# Altium footprint library 04.连接器件.pcb.PCBLIB: 363 footprints (part 7 of 23)
Each footprint in its own frame and in the unit in brackets; x right, y up, seen from the top. Pads: shape width x height; smd on the part's side, far side on the other; paste and mask are expansions set on the pad; w line width, h text height; cw(c..) or ccw(c..) is an arc to the next point about the centre after c.
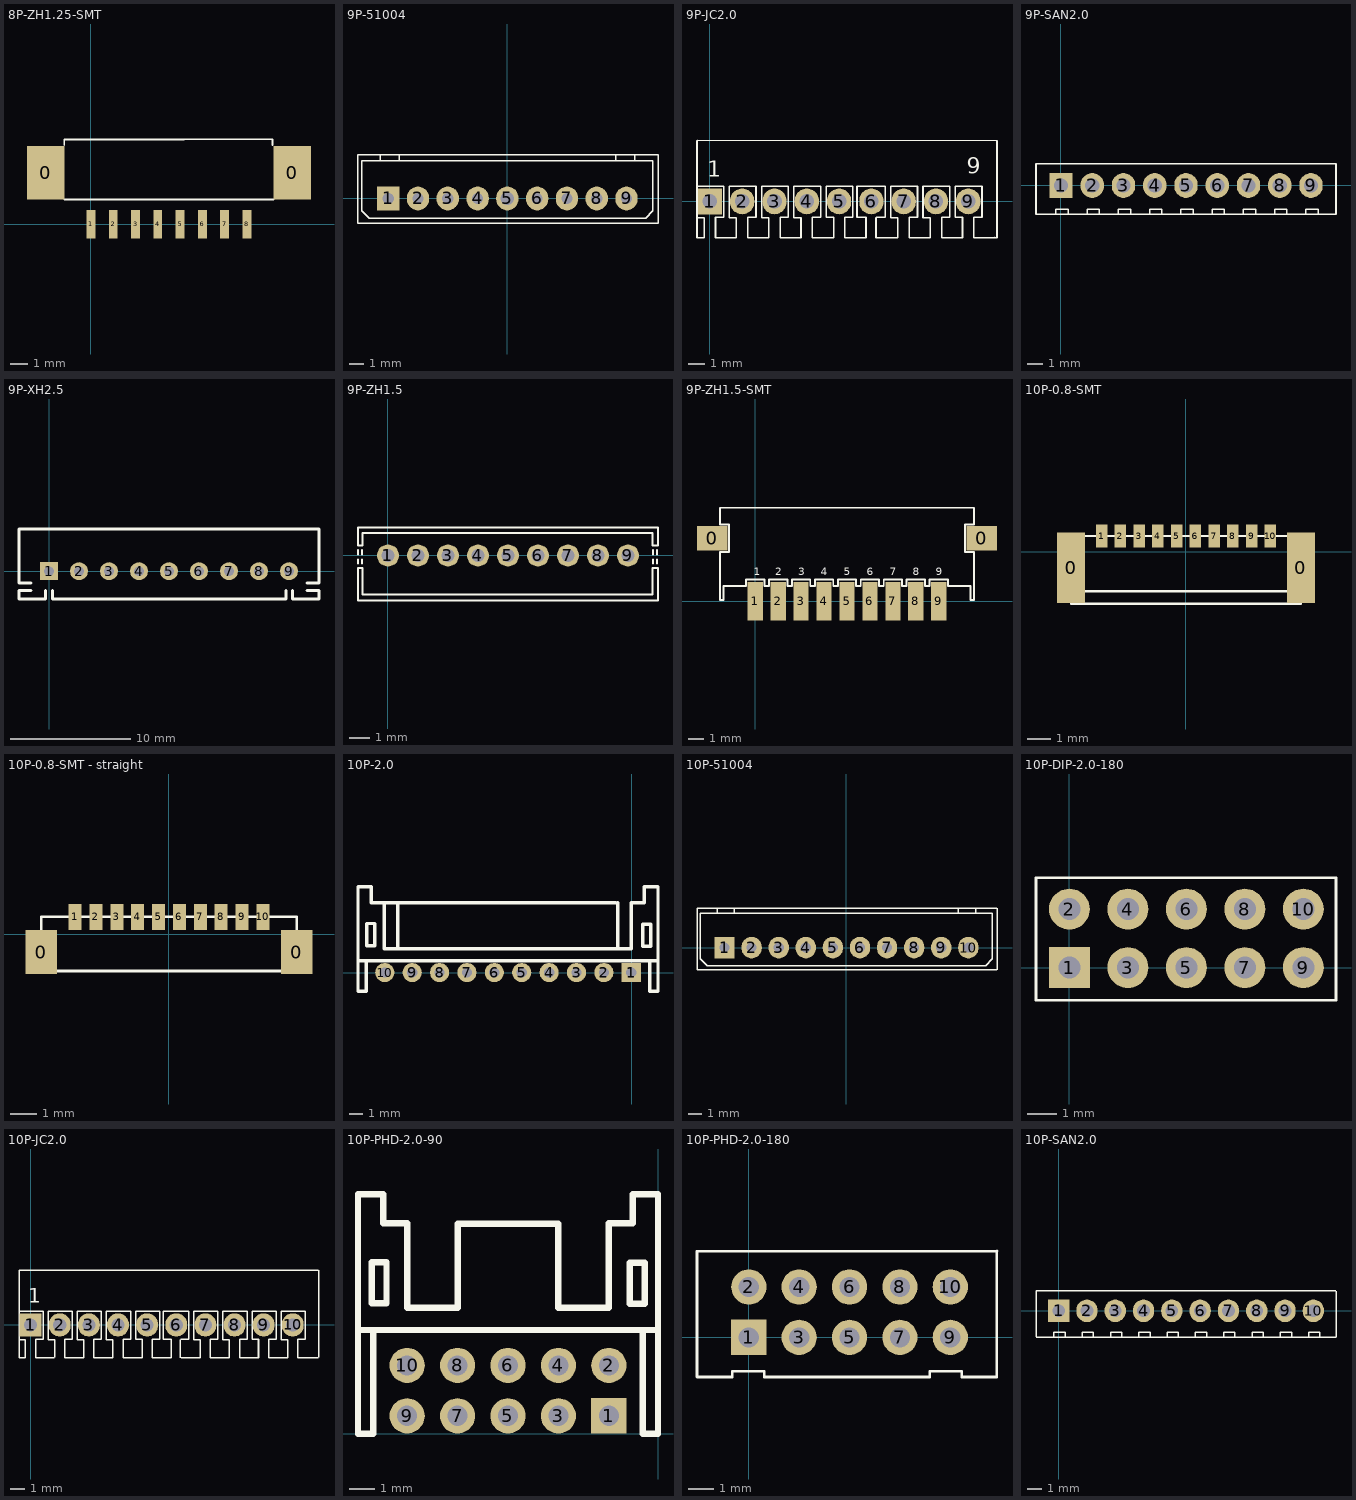
[diagram p6: the footprints below, top view; thin cyan lines are the x and y axes]

## 8P-ZH1.25-SMT [mm]
pads (10):
  rect 2.1x3 smd: 0(-2.54,2.896) 0(11.299,2.896)
  rect 0.5x1.6 smd: 1(0,0) 2(1.25,0) 3(2.5,0) 4(3.75,0) 5(5,0) 6(6.25,0) 7(7.5,0) 8(8.75,0)
TopOverlay:
  lines w0.1: -1.5,1.4 0,1.4 5.25,1.4 10.25,1.4 ; -1.5,4.445 -1.5,4.774 5.232,4.774 10.185,4.775 ; 10.184,4.445 10.184,4.774
3D body: height 0.3, standoff 0, extent 8.382,-0.889 9.144,0.889
3D body: height 0.3, standoff 0, extent 7.112,-0.889 7.874,0.889
3D body: height 0.3, standoff 0, extent 5.842,-0.889 6.604,0.889
3D body: height 0.3, standoff 0, extent 4.572,-0.889 5.334,0.889
3D body: height 0.3, standoff 0, extent 3.302,-0.889 4.064,0.889
3D body: height 0.3, standoff 0, extent 2.159,-0.889 2.921,0.889
3D body: height 0.3, standoff 0, extent 0.889,-0.889 1.651,0.889
3D body: height 0.3, standoff 0, extent -0.381,-0.889 0.381,0.889
3D body: height 3.7, standoff 0, extent -1.499,4.75 10.185,4.775
3D body: height 3.7, standoff 0, extent -1.499,1.397 10.211,4.775

## 9P-51004 [mm]
pads (9):
  rect 1.5x1.6 hole 0.75: 1(-8,0)
  oval 1.5x1.6 hole 0.75: 2(-6,0) 3(-4,0) 4(-2,0) 6(2,0) 7(4,0) 8(6,0) 9(8,0)
  oval 1.5x1.6 hole 0.9: 5(0,0)
TopOverlay:
  lines w0.1: -8.54,2.54 -8.54,2.921 ; -7.27,2.54 -7.27,2.921 ; 2.226,2.54 9.774,2.54 9.774,-0.833 9.282,-1.325 5,-1.325 ; 2.286,2.54 -9.774,2.54 -9.774,-0.833 -9.282,-1.325 5.055,-1.325 ; 7.27,2.54 7.27,2.921 ; 8.54,2.54 8.54,2.921 ; -10.032,-1.651 -10.032,2.921 10.115,2.921 10.115,-1.651 -10.032,-1.651
3D body "510004-9.STEP": height 5.9, standoff -3.47, extent -9.957,-1.565 10.043,2.835

## 9P-JC2.0 [mm]
pads (9):
  rect 1.5x1.6 hole 0.9: 1(0,0)
  oval 1.5x1.6 hole 0.9: 2(2,0) 3(4,0) 4(6,0) 5(8,0) 6(10,0) 7(12,0) 8(14,0) 9(16,0)
TopOverlay:
  lines w0.1: -0.8,3.75 -0.8,0.94 ; -0.787,3.785 17.78,3.75 17.78,-2.25 ; 1.623,-2.25 0.349,-2.25 0.349,-0.991 0.857,-0.991 0.857,0.94 -0.8,0.94 ; 1.638,-2.235 1.638,-1.016 1.2,-1.016 1.2,0.94 2.857,0.94 2.857,-0.991 2.349,-0.991 2.349,-2.25 3.2,-2.25 3.623,-2.25 3.638,-2.235 3.638,-1.016 3.2,-1.016 3.2,0.94 4.857,0.94 4.857,-0.991 4.349,-0.991 4.349,-2.25 5.623,-2.25 5.638,-2.235 5.638,-1.016 5.2,-1.016 5.2,0.94 6.857,0.94 6.857,-0.991 6.349,-0.991 6.349,-2.25 7.67,-2.25 7.67,-0.991 7.2,-0.991 7.2,0.94 8.857,0.94 8.857,-0.991 8.349,-0.991 8.349,-2.25 9.67,-2.25 9.67,-0.991 9.111,-0.991 9.111,0.94 10.864,0.94 10.864,-0.991 10.305,-0.991 ; 7.623,-2.25 7.638,-2.235 ; 10.289,-2.25 10.289,-1.005 ; 10.349,-2.25 11.2,-2.25 11.623,-2.25 11.638,-2.235 11.638,-1.016 11.2,-1.016 11.2,0.94 12.857,0.94 12.857,-0.991 12.349,-0.991 12.349,-2.25 13.623,-2.25 13.638,-2.235 13.638,-1.016 13.2,-1.016 13.2,0.94 14.857,0.94 14.857,-0.991 14.349,-0.991 14.349,-2.25 15.67,-2.25 15.67,-0.991 15.2,-0.991 15.2,0.94 16.857,0.94 ; 10.349,-0.991 10.857,-0.991 10.857,0.94 ; 15.623,-2.25 15.638,-2.235 15.638,-1.016 ; 16.329,-2.25 16.329,-0.991 16.837,-0.991 16.837,0.94 ; 16.36,-2.25 17.771,-2.25 ; 17.638,-2.235 17.623,-2.25 17.2,-2.25 16.349,-2.25 ; -0.8,-1.016 -0.8,-2.25 -0.377,-2.25 -0.362,-2.235 -0.362,-1.016 -0.8,-1.016 ; -0.8,-1.016 -0.8,0.94 ; 16.349,-2.25 16.349,-0.991 ; 16.349,-2.25 16.349,-0.991 ; 16.349,-0.991 16.857,-0.991 ; 16.349,-0.991 16.857,-0.991 ; 16.857,-0.991 16.857,0.94 ; 16.857,-0.991 16.857,0.94
  text "1" at -0.152,1.524 h1
  text "9" at 15.9,1.727 h1
3D body "9P-JC2.0.STEP": height 3.4, standoff -3.22, extent -1.219,-7.112 17.281,3.888

## 9P-SAN2.0 [mm]
pads (9):
  rect 1.5x1.6 hole 0.9: 1(0,0)
  oval 1.5x1.6 hole 0.9: 2(2,0) 3(4,0) 4(6,0) 5(8,0) 6(10,0) 7(12,0) 8(14,0) 9(16,0)
TopOverlay:
  lines w0.1: -1.6,-1.85 -1.6,1.4 17.577,1.4 ; -1.575,-1.854 17.551,-1.854 ; -0.33,-1.85 -0.33,-1.524 0.457,-1.524 0.457,-1.85 ; 1.67,-1.85 1.67,-1.524 2.457,-1.524 2.457,-1.85 ; 3.67,-1.85 3.67,-1.524 4.457,-1.524 4.457,-1.85 ; 5.67,-1.85 5.67,-1.524 6.457,-1.524 6.457,-1.85 ; 7.67,-1.85 7.67,-1.524 8.457,-1.524 8.457,-1.85 ; 9.67,-1.85 9.67,-1.524 10.457,-1.524 10.457,-1.85 ; 11.67,-1.85 11.67,-1.524 12.457,-1.524 12.457,-1.85 ; 13.67,-1.85 13.67,-1.524 14.457,-1.524 14.457,-1.85 ; 15.67,-1.85 15.67,-1.524 16.457,-1.524 16.457,-1.85 ; 17.592,-1.85 17.6,-1.842 ; 17.601,-1.854 17.601,1.397
3D body "9P-SAN2.0.STEP": height 11, standoff -3.19, extent -1.6,-1.854 17.6,1.396

## 9P-XH2.5 [mm]
pads (9):
  rect 1.5x1.5 hole 0.8: 1(0,0)
  round 1.5 hole 0.8: 2(2.5,0) 3(5,0) 4(7.5,0) 5(10,0) 6(12.5,0) 7(15,0) 8(17.5,0) 9(20,0)
TopOverlay:
  lines w0.254: -1.5,-1.6 -2.5,-1.6 -2.5,-2.3 -0.6,-2.3 ; -1.5,-1 -2.5,-1 -2.5,3.5 5,3.5 ; -0.9,-2.3 -0.3,-2.3 -0.3,-1.6 ; 0.3,-1.6 0.3,-2.3 0.6,-2.3 1.6,-2.3 19.6,-2.3 ; 4.7,3.5 22.428,3.5 ; 19.5,-2.3 19.736,-2.3 19.736,-1.6 ; 20.3,-1.6 20.3,-2.3 20.9,-2.3 ; 20.6,-2.3 22.5,-2.3 22.5,-1.6 21.5,-1.6 ; 21.5,-1 22.5,-1 22.5,3.5
3D body "9PIN-XH2.5.STEP": height 5.9, standoff -3.47, extent -2.489,-2.286 22.411,3.464

## 9P-ZH1.5 [mm]
pads (9):
  round 1.1 hole 0.65: 1(0,0) 2(1.5,0) 3(3,0) 4(4.5,0) 5(6,0) 6(7.5,0) 7(9,0) 8(10.5,0) 9(12,0)
TopOverlay:
  lines w0.1: -1.499,-0.406 -1.499,-0.203 ; -1.499,0.051 -1.499,0.279 ; -1.295,-0.406 -1.295,-0.203 ; -1.295,0.051 -1.295,0.279 ; 13.242,-0.406 13.242,-0.203 ; 13.242,0.051 13.242,0.279 ; 13.445,-0.406 13.445,-0.203 ; 13.445,0.051 13.445,0.279 ; 13.5,-0.682 13.5,-2.25 -1.5,-2.25 -1.5,-0.635 -1.27,-0.635 -1.27,-1.956 13.216,-1.956 13.216,-0.635 13.5,-0.635 ; -1.5,0.508 -1.5,1.4 13.491,1.4 13.5,1.391 13.5,0.508 13.216,0.508 13.216,1.118 -1.27,1.118 -1.27,0.508 -1.5,0.508
3D body "9P-ZH1.5.STEP": height 4.6, standoff -2.45, extent -1.499,-2.261 13.501,1.389

## 9P-ZH1.5-SMT [mm]
pads (11):
  rect 2x1.6 smd: 0(-2.8,4.1) 0(14.8,4.1)
  rect 1x2.5 smd: 1(0,0) 2(1.5,0) 3(3,0) 4(4.5,0) 5(6,0) 6(7.5,0) 7(9,0) 8(10.5,0) 9(12,0)
TopOverlay:
  lines w0.127: 9.61,0.99 9.6,1 ; 12.7,6.1 14.3,6.1 14.3,5 13.7,5 13.7,3.2 14.3,3.2 14.3,0.07 14.07,0.07 14.07,0.99 12.61,0.99 ; 12.8,6.1 11.2,6.1 -2.3,6.1 -2.3,5 -1.7,5 -1.7,3.2 -2.3,3.2 -2.3,0.07 -2.07,0.07 -2.07,0.99 -0.61,0.99 -0.6,1 -0.6,1.4 0.6,1.4 0.6,1 0.9,1 0.9,1.4 2.1,1.4 2.1,1 2.4,1 2.4,1.4 3.6,1.4 3.6,1 3.9,1 3.9,1.4 5.1,1.4 5.1,1 5.4,1 5.4,1.4 6.6,1.4 6.6,1 6.9,1 6.9,1.4 8.1,1.4 8.1,1 8.4,1 ; 8.4,1 8.4,1.4 ; 8.4,1 8.4,1.4 ; 8.4,1.4 9.6,1.4 ; 8.4,1.4 9.6,1.4 ; 9.6,1 9.6,1.4 ; 9.6,1 9.6,1.4 ; 9.6,1 9.9,1 ; 9.9,1 9.9,1.4 ; 9.9,1 9.9,1.4 ; 9.9,1 9.9,1.4 ; 9.9,1.4 11.1,1.4 ; 9.9,1.4 11.1,1.4 ; 9.9,1.4 11.1,1.4 ; 11.1,1 11.1,1.4 ; 11.1,1 11.11,0.99 ; 11.1,1 11.1,1.4 ; 11.1,1 11.4,1 11.4,1.4 12.6,1.4 ; 11.1,1 11.1,1.4 ; 11.1,1 11.11,0.99 ; 11.1,1 11.11,0.99 ; 11.1,1 11.1,1.4 ; 12.6,1 12.6,1.4 ; 12.6,1 12.61,0.99 ; 12.6,1 12.61,0.99 ; 12.6,1 12.6,1.4
  text "9" at 11.8,1.7 h0.5
  text "6" at 7.3,1.7 h0.5
  text "7" at 8.8,1.7 h0.5
  text "1" at -0.1,1.7 h0.5
  text "2" at 1.3,1.7 h0.5
  text "3" at 2.8,1.7 h0.5
  text "4" at 4.3,1.7 h0.5
  text "5" at 5.8,1.7 h0.5
  text "8" at 10.3,1.7 h0.5
3D body "9P-ZH1.5-SMT.STEP": height 3.7, standoff -0.25, extent -2.261,-0.432 14.239,6.068

## 10P-0.8-SMT [mm]
pads (12):
  rect 1.2x3 smd: 0(-4.9,-0.675) 0(4.9,-0.675)
  rect 0.5x1 smd: 1(-3.6,0.675) 2(-2.8,0.675) 3(-2,0.675) 4(-1.2,0.675) 5(-0.4,0.675) 6(0.4,0.675) 7(1.2,0.675) 8(2,0.675) 9(2.8,0.675) 10(3.6,0.675)
TopOverlay:
  lines w0.1: 4.893,-1.687 4.892,-1.688 -4.9,-1.688 ; -4.9,-1.688 -4.9,-0.675 -4.9,0.675 -4.279,0.675 -3.6,0.675 3.6,0.675 4.391,0.675 4.9,0.675 4.9,-0.675 4.9,-2.214 -4.9,-2.214 -4.9,-1.688
3D body: height 1.8, standoff 0, extent -4.9,-2.214 4.9,0.675

## 10P-0.8-SMT - straight [mm]
height 3
pads (12):
  rect 1.2x1.7 smd: 0(-4.9,-0.675) 0(4.9,-0.675)
  rect 0.5x1 smd: 1(-3.6,0.675) 2(-2.8,0.675) 3(-2,0.675) 4(-1.2,0.675) 5(-0.4,0.675) 6(0.4,0.675) 7(1.2,0.675) 8(2,0.675) 9(2.8,0.675) 10(3.6,0.675)
TopOverlay:
  lines w0.1: -4.9,-1.4 -4.9,-0.675 -4.9,0.675 -4.279,0.675 -3.6,0.675 3.6,0.675 4.391,0.675 4.9,0.675 4.9,-0.675 4.9,-1.4 -4.9,-1.4
3D body: height 1.8, standoff 0, extent -4.9,-1.4 4.9,0.675

## 10P-2.0 [mm]
pads (10):
  rect 1.4x1.4 hole 0.75: 1(-0.051,0.025)
  round 1.4 hole 0.75: 2(-2.051,0.025) 3(-4.051,0.025) 4(-6.051,0.025) 5(-8.051,0.025) 6(-10.051,0.025) 7(-12.051,0.025) 8(-14.051,0.025) 9(-16.051,0.025) 10(-18.051,0.025)
TopOverlay:
  lines w0.254: -19.963,0.89 -19.352,0.89 -18.947,0.89 -11.401,0.89 1.899,0.89 ; -19.401,0.89 -19.401,-1.325 -20.007,-1.325 -20.007,6.275 -19.042,6.275 -19.042,5.107 -18.542,5.107 -17.602,5.107 -9.051,5.107 -1.174,5.107 ; -18.102,5.107 -18.102,1.779 -16.602,1.779 -10.051,1.779 -0.051,1.779 -0.051,5.132 0.899,5.132 0.899,6.275 1.899,6.275 1.899,-1.325 1.299,-1.325 1.299,0.89 ; -17.102,1.779 -17.102,5.107 ; -1.051,1.779 -1.051,5.107 ; 1.326,0.89 1.776,0.89 ; -19.38,1.981 -18.796,1.981 -18.796,3.607 -19.38,3.607 -19.38,1.981 ; 0.782,1.932 0.782,3.557 1.366,3.557 1.366,1.932 0.782,1.932
3D body: height 5, standoff 0, extent -20.007,-1.325 1.899,6.275

## 10P-51004 [mm]
pads (10):
  rect 1.5x1.6 hole 0.75: 1(-9,0)
  oval 1.5x1.6 hole 0.75: 2(-7,0) 3(-5,0) 4(-3,0) 5(-1,0) 6(1,0) 7(3,0) 8(5,0) 9(7,0) 10(9,0)
TopOverlay:
  lines w0.1: -9.54,2.54 -9.54,2.921 ; -8.27,2.54 -8.27,2.921 ; 3.124,2.54 10.774,2.54 10.774,-0.833 10.282,-1.325 6,-1.325 ; 3.15,2.54 -10.774,2.54 -10.774,-0.833 -10.282,-1.325 5.994,-1.325 ; 8.27,2.54 8.27,2.921 ; 9.54,2.54 9.54,2.921 ; 11.09,-1.651 -11.032,-1.651 -11.032,2.921 11.09,2.921 ; 11.115,-1.651 11.115,2.921
3D body "510004-10.STEP": height 5.9, standoff -3.47, extent -10.959,-1.575 11.041,2.825

## 10P-DIP-2.0-180 [mm]
pads (10):
  rect 1.4x1.4 hole 0.75: 1(0,0)
  round 1.4 hole 0.75: 2(0,2) 3(2,0) 4(2,2) 5(4,0) 6(4,2) 7(6,0) 8(6,2) 9(8,0) 10(8,2)
TopOverlay:
  lines w0.1: -1.143,-1.118 -1.143,3.073 9.119,3.073 9.119,-1.118 -1.143,-1.118
3D body "DIP10(2.0)排针.": height 8, standoff -2.6, extent -1.041,-1.041 8.959,2.959

## 10P-JC2.0 [mm]
pads (10):
  rect 1.5x1.6 hole 0.9: 1(0,0)
  oval 1.5x1.6 hole 0.9: 2(2,0) 3(4,0) 4(6,0) 5(8,0) 6(10,0) 7(12,0) 8(14,0) 9(16,0) 10(18,0)
TopOverlay:
  lines w0.1: 1.623,-2.25 0.349,-2.25 0.349,-0.991 0.857,-0.991 0.857,0.94 -0.8,0.94 ; 1.638,-2.235 1.638,-1.016 1.2,-1.016 1.2,0.94 2.857,0.94 2.857,-0.991 2.349,-0.991 2.349,-2.25 3.2,-2.25 3.623,-2.25 3.638,-2.235 3.638,-1.016 3.2,-1.016 3.2,0.94 4.857,0.94 4.857,-0.991 4.349,-0.991 4.349,-2.25 5.623,-2.25 5.638,-2.235 5.638,-1.016 5.2,-1.016 5.2,0.94 6.857,0.94 6.857,-0.991 6.349,-0.991 6.349,-2.25 7.67,-2.25 7.67,-0.991 7.2,-0.991 7.2,0.94 8.857,0.94 8.857,-0.991 8.349,-0.991 8.349,-2.25 9.67,-2.25 9.67,-0.991 9.111,-0.991 9.111,0.94 10.864,0.94 10.864,-0.991 10.305,-0.991 ; 7.623,-2.25 7.638,-2.235 ; 10.289,-2.25 10.289,-1.005 ; 10.349,-2.25 11.2,-2.25 11.623,-2.25 11.638,-2.235 11.638,-1.016 11.2,-1.016 11.2,0.94 12.857,0.94 12.857,-0.991 12.349,-0.991 12.349,-2.25 13.623,-2.25 13.638,-2.235 13.638,-1.016 13.2,-1.016 13.2,0.94 14.857,0.94 14.857,-0.991 14.349,-0.991 14.349,-2.25 15.67,-2.25 15.67,-0.991 15.2,-0.991 15.2,0.94 16.857,0.94 ; 10.349,-0.991 10.857,-0.991 10.857,0.94 ; 15.623,-2.25 15.638,-2.235 15.638,-1.016 ; 19.761,-2.25 18.349,-2.25 18.349,-0.991 18.857,-0.991 18.857,0.94 17.2,0.94 17.2,-1.016 17.638,-1.016 17.638,-2.235 17.623,-2.25 17.2,-2.25 16.349,-2.25 ; 19.761,3.75 -0.8,3.75 -0.8,0.94 ; 19.8,-2.228 19.8,3.75 ; -0.8,-1.016 -0.8,-2.25 -0.377,-2.25 -0.362,-2.235 -0.362,-1.016 -0.8,-1.016 ; -0.8,-1.016 -0.8,0.94 ; 16.349,-2.25 16.349,-0.991 ; 16.349,-2.25 16.349,-0.991 ; 16.349,-0.991 16.857,-0.991 ; 16.349,-0.991 16.857,-0.991 ; 16.857,-0.991 16.857,0.94 ; 16.857,-0.991 16.857,0.94
  text "1" at -0.152,1.524 h1
3D body "10P-JC2.0.STEP": height 3.4, standoff -3.22, extent -1.295,-7.188 19.205,3.812

## 10P-PHD-2.0-90 [mm]
pads (10):
  rect 1.4x1.4 hole 0.8: 1(-1.95,0.711)
  round 1.4 hole 0.8: 2(-1.95,2.711) 3(-3.95,0.711) 4(-3.95,2.711) 5(-5.95,0.711) 6(-5.95,2.711) 7(-7.95,0.711) 8(-7.95,2.711) 9(-9.95,0.711) 10(-9.95,2.711)
TopOverlay:
  lines w0.254: -11.9,4.115 -0.6,4.115 ; -11.3,4.115 -11.3,0 -11.9,0 -11.9,9.5 -10.9,9.5 -10.9,8.357 -9.95,8.357 -9.95,5.004 -7.95,5.004 -7.95,8.331 -3.95,8.331 -3.95,5.004 -1.95,5.004 -1.95,8.357 -1,8.357 -1,9.5 0,9.5 0,0 -0.6,0 -0.6,4.115 ; 0,4.115 -0.6,4.115 ; -11.354,5.182 -10.77,5.182 -10.77,6.807 -11.354,6.807 -11.354,5.182 ; -1.118,5.156 -0.533,5.156 -0.533,6.782 -1.118,6.782 -1.118,5.156
3D body: height 5, standoff 0, extent -11.9,0 0,9.5

## 10P-PHD-2.0-180 [mm]
pads (10):
  rect 1.4x1.4 hole 0.8: 1(0,0)
  round 1.4 hole 0.8: 2(0,2) 3(2,0) 4(2,2) 5(4,0) 6(4,2) 7(6,0) 8(6,2) 9(8,0) 10(8,2)
TopOverlay:
  lines w0.1: 9.849,3.425 9.849,-1.575 8.452,-1.575 8.452,-1.346 7.182,-1.346 7.182,-1.575 0.61,-1.575 0.61,-1.346 -0.66,-1.346 -0.66,-1.575 -2.057,-1.575 -2.057,3.425 9.855,3.429
3D body "IDC10(2.0).STEP": height 6.5, standoff -2.6, extent -2.108,-1.575 9.892,3.425

## 10P-SAN2.0 [mm]
pads (10):
  rect 1.5x1.6 hole 0.9: 1(0,0)
  oval 1.5x1.6 hole 0.9: 2(2,0) 3(4,0) 4(6,0) 5(8,0) 6(10,0) 7(12,0) 8(14,0) 9(16,0) 10(18,0)
TopOverlay:
  lines w0.1: -1.6,-1.85 -1.6,1.4 19.583,1.4 ; -1.575,-1.854 19.583,-1.854 ; -0.33,-1.85 -0.33,-1.524 0.457,-1.524 0.457,-1.85 ; 1.67,-1.85 1.67,-1.524 2.457,-1.524 2.457,-1.85 ; 3.67,-1.85 3.67,-1.524 4.457,-1.524 4.457,-1.85 ; 5.67,-1.85 5.67,-1.524 6.457,-1.524 6.457,-1.85 ; 7.67,-1.85 7.67,-1.524 8.457,-1.524 8.457,-1.85 ; 9.67,-1.85 9.67,-1.524 10.457,-1.524 10.457,-1.85 ; 11.67,-1.85 11.67,-1.524 12.457,-1.524 12.457,-1.85 ; 13.67,-1.85 13.67,-1.524 14.457,-1.524 14.457,-1.85 ; 15.67,-1.85 15.67,-1.524 16.457,-1.524 16.457,-1.85 ; 17.67,-1.85 17.67,-1.524 18.457,-1.524 18.457,-1.85 ; 19.592,-1.85 19.6,-1.842 ; 19.601,-1.854 19.601,1.397
3D body "10P-SAN2.0.STEP": height 11, standoff -3.19, extent -1.6,-1.854 19.6,1.396